# Altium footprint library lib_protel_HC_BOINA.PCBLIB: 726 footprints (part 7 of 46)
Each footprint in its own frame and in the unit in brackets; x right, y up, seen from the top. Pads: shape width x height; smd on the part's side, far side on the other; paste and mask are expansions set on the pad; w line width, h text height; cw(c..) or ccw(c..) is an arc to the next point about the centre after c.
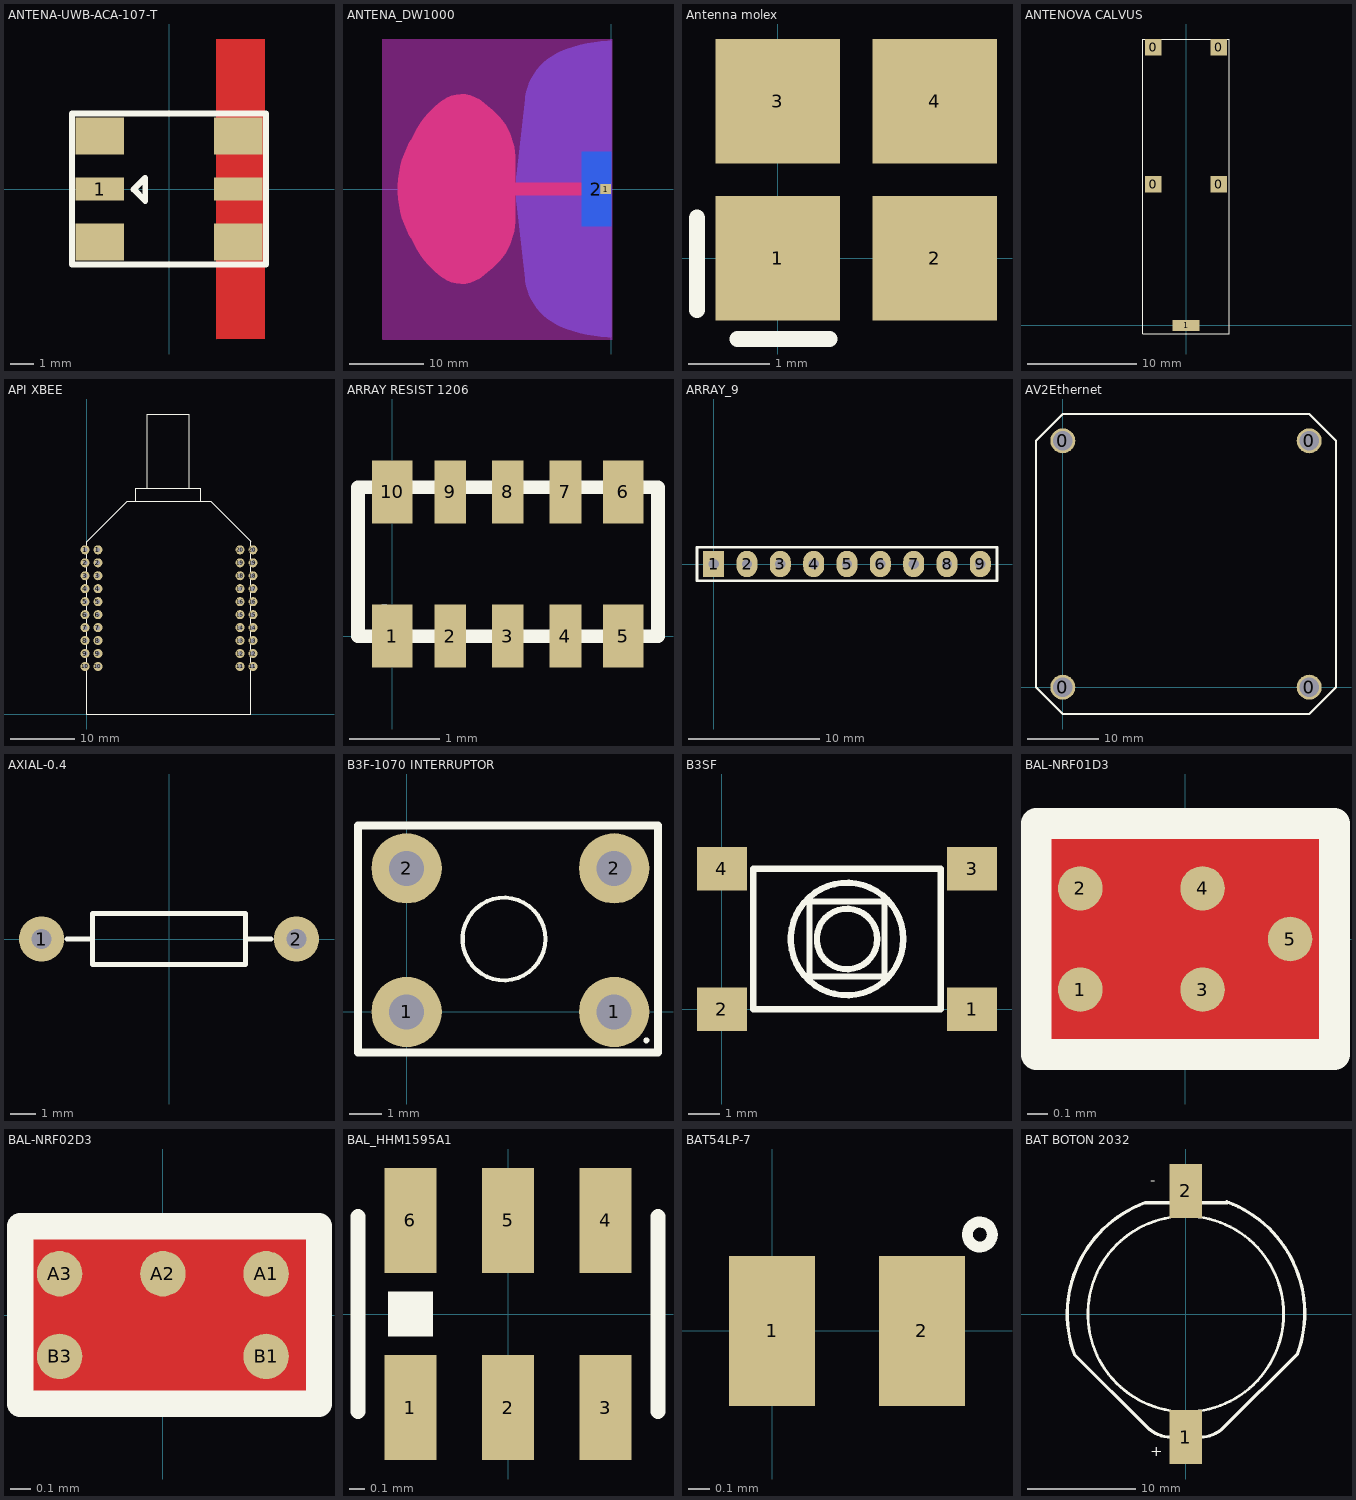
[diagram p6: the footprints below, top view; thin cyan lines are the x and y axes]

## ANTENA-UWB-ACA-107-T [mm] "Antena UWB ACA-107-T Abracom"
height 1.2
pads (6):
  rect 2.1x1 smd: 1(-3,0) ""(3,0)
  rect 2.1x1.6 smd: ""(-3,-2.3) ""(-3,2.3) ""(3,-2.3) ""(3,2.3)
Top Layer:
  region: 2.051,6.499 4.146,6.499 4.147,6.499 4.147,-6.499 2.049,-6.499
Top Overlay:
  lines w0.254: -4.2,-3.275 -4.2,3.275 4.2,3.275 4.2,-3.275 -4.2,-3.275 ; -1.531,-0.017 -1.031,-0.517 -1.031,0.483 -1.531,-0.017
3D body: height 1.2, standoff 0, extent -4,-3 4,3

## ANTENA_DW1000 [mm]
pads (2):
  rect 1.4x1.4 smd: 1(-0.77,0)
  rect 4x10 smd far side: 2(-2.005,0)
Top Layer:
  region: -26.165,-8.217 -26.166,-8.217 -27.034,-6.665 -27.034,-6.664 -27.252,-6.287 -27.638,-5.504 -27.972,-4.698 -28.253,-3.871 -28.479,-3.028 -28.649,-2.172 -28.763,-1.307 -28.82,-0.436 -28.82,0 -28.82,0.436 -28.763,1.307 -28.649,2.172 -28.479,3.028 -28.253,3.871 -27.972,4.698 -27.638,5.504 -27.252,6.287 -27.034,6.664 -27.034,6.665 -26.166,8.217 -26.165,8.217 -26.001,8.516 -25.636,9.091 -25.236,9.642 -24.801,10.167 -24.333,10.663 -23.836,11.128 -23.309,11.561 -22.757,11.96 -22.468,12.141 -22.19,12.315 -21.589,12.573 -20.956,12.737 -20.305,12.802 -19.652,12.768 -19.011,12.635 -18.398,12.406 -17.828,12.086 -17.57,11.885 -16.311,10.897 -16.31,10.895 -16.052,10.694 -15.567,10.252 -15.117,9.775 -14.705,9.266 -14.332,8.727 -14.001,8.161 -13.714,7.572 -13.472,6.963 -13.277,6.338 -13.129,5.699 -13.03,5.051 -12.981,4.398 -12.981,4.07 -12.981,0.82 -12.976,0.815 -0.005,0.815 -0.005,-0.815 -12.976,-0.815 -12.981,-0.82 -12.981,-4.07 -12.981,-4.398 -13.03,-5.051 -13.129,-5.699 -13.277,-6.338 -13.472,-6.963 -13.714,-7.572 -14.001,-8.161 -14.332,-8.727 -14.705,-9.266 -15.117,-9.775 -15.567,-10.252 -16.052,-10.694 -16.31,-10.895 -16.311,-10.897 -17.57,-11.885 -17.828,-12.086 -18.398,-12.406 -19.011,-12.635 -19.652,-12.768 -20.305,-12.802 -20.956,-12.737 -21.589,-12.573 -22.19,-12.315 -22.468,-12.141 -22.757,-11.96 -23.309,-11.561 -23.836,-11.128 -24.333,-10.663 -24.801,-10.167 -25.236,-9.642 -25.636,-9.091 -26.001,-8.516
Bottom Layer:
  region: -12.771,-1.998 -12.795,-1.749 -12.832,-1.25 -12.856,-0.75 -12.868,-0.25 -12.868,0 -12.868,0.25 -12.856,0.75 -12.832,1.25 -12.795,1.749 -12.771,1.998 -11.618,12.147 -11.584,12.477 -11.46,13.128 -11.281,13.766 -11.049,14.387 -10.764,14.985 -10.43,15.557 -10.048,16.099 -9.621,16.606 -9.153,17.075 -8.646,17.502 -8.105,17.885 -7.533,18.22 -7.234,18.363 -6.812,18.564 -5.947,18.919 -5.064,19.225 -4.165,19.482 -3.253,19.689 -2.331,19.844 -1.401,19.948 -0.468,20 0,20 0,-20 -0.468,-20 -1.401,-19.948 -2.331,-19.844 -3.253,-19.689 -4.165,-19.482 -5.064,-19.225 -5.947,-18.919 -6.812,-18.564 -7.234,-18.363 -7.533,-18.22 -8.105,-17.885 -8.646,-17.502 -9.153,-17.075 -9.621,-16.606 -10.048,-16.099 -10.43,-15.557 -10.764,-14.985 -11.049,-14.387 -11.281,-13.766 -11.46,-13.128 -11.584,-12.477 -11.618,-12.147
Keep-Out Layer:
  region: -30.88,-20.25 -30.88,20.25 0.12,20.25 0.12,-20.25
  lines w0.01: 0.12,-20.25 -30.88,-20.25 -30.88,20.25 0.12,20.25

## Antenna molex [mm] "0479480001"
pads (4):
  rect 1.54x1.54 smd: 1(0,0) 2(1.94,0) 3(0,1.94) 4(1.94,1.94)
Top Overlay:
  lines w0.2: -1,-0.64 -1,0.5 ; -0.5,-1 0.64,-1

## ANTENOVA CALVUS [mm] "ANTENA GPRS ANTENOVA CALVUS"
height 3.2
pads (5):
  rect 1.5x1.5 smd: 0(-3,12.95) 0(-3,25.51) 0(3,12.95) 0(3,25.51)
  rect 2.5x1 smd: 1(0,0)
Top Overlay:
  lines w0.08: -3.96,-0.75 3.96,-0.75 3.96,26.25 -3.96,26.25 -3.96,-0.75

## API XBEE [mm] "MODULO ZIGBEE DIGI"
height 3
pads (40):
  round 1.4 hole 0.7: 1(-0.27,25.419) 1(1.73,25.419) 2(-0.27,23.413) 2(1.73,23.413) 3(-0.27,21.406) 3(1.73,21.406) 4(-0.27,19.4) 4(1.73,19.4) 5(-0.27,17.393) 5(1.73,17.393) 6(-0.27,15.386) 6(1.73,15.386) 7(-0.27,13.38) 7(1.73,13.38) 8(-0.27,11.373) 8(1.73,11.373) 9(-0.27,9.367) 9(1.73,9.367) 10(-0.27,7.36) 10(1.73,7.36) 11(23.73,7.36) 11(25.73,7.36) 12(23.73,9.367) 12(25.73,9.367) 13(23.73,11.373) 13(25.73,11.373) 14(23.73,13.38) 14(25.73,13.38) 15(23.73,15.386) 15(25.73,15.386) 16(23.73,17.393) 16(25.73,17.393) 17(23.73,19.4) 17(25.73,19.4) 18(23.73,21.406) 18(25.73,21.406) 19(23.73,23.413) 19(25.73,23.413) 20(23.73,25.419) 20(25.73,25.419)
Top Overlay:
  lines w0.152: 0,26.5 0,0 25.4,0 25.4,26.5 ; 0,26.51 0,26.64 6.3,32.94 7.97,32.94 ; 7.95,32.94 17.45,32.94 ; 9.33,34.95 9.33,46.45 15.83,46.45 15.83,34.95 ; 17.41,32.94 19.21,32.94 25.4,26.75 25.4,26.49 ; 7.62,32.94 17.62,32.94 17.62,34.94 7.63,34.94 7.62,34.95 7.62,32.94

## ARRAY RESIST 1206 [mm]
height 0.6
pads (10):
  rect 0.45x0.7 smd: 1(0,0) 5(2.56,0) 6(2.56,1.6) 10(0,1.6)
  rect 0.35x0.7 smd: 2(0.64,0) 3(1.28,0) 4(1.92,0) 7(1.92,1.6) 8(1.28,1.6) 9(0.64,1.6)
Top Overlay:
  circle w0.127: c-0.09,0.26 r0.028
  lines w0.15: -0.381,0 2.946,0 2.946,1.651 -0.381,1.651 -0.381,0

## ARRAY_9 [mm] "array resistencias 9 pines"
pads (9):
  rect 1.6x2 hole 0.8: 1(0,0)
  oval 1.6x2 hole 0.8: 2(2.54,0) 3(5.08,0) 4(7.62,0) 5(10.16,0) 6(12.7,0) 7(15.24,0) 8(17.78,0) 9(20.32,0)
Top Overlay:
  lines w0.2: -1.27,-1.27 -1.27,1.27 21.59,1.27 21.59,-1.27 -1.27,-1.27

## AV2Ethernet [mm]
height 8
pads (4):
  round 3.5 hole 2.7: 0(0,0) 0(0,34.5) 0(34.5,0) 0(34.5,34.5)
Top Overlay:
  lines w0.3: -3.75,0 0,-3.75 34.5,-3.75 38.25,0 38.25,34.5 34.5,38.25 0,38.25 -3.75,34.5 -3.75,0

## AXIAL-0.4 [mm] "resistencia normal"
pads (2):
  round 1.8 hole 0.8: 1(-5.08,0) 2(5.08,0)
Top Overlay:
  lines w0.2: -4.064,0 -3.048,0 ; 3.048,0 4.064,0 ; -3.048,-1.016 -3.048,1.016 3.048,1.016 3.048,-1.016 -3.048,-1.016

## B3F-1070 INTERRUPTOR [mm] "INTERRUPTOR BOTÓN VERTICAL"
height 9.5
pads (4):
  round 2.2 hole 1.1: 1(0,0) 1(6.5,0) 2(0,4.5) 2(6.5,4.5)
Top Overlay:
  circle w0.127: c7.51,-0.89 r0.028
  circle w0.127: c3.048,2.286 r1.295
  lines w0.254: -1.524,-1.27 -1.524,5.842 7.874,5.842 7.874,-1.27 -1.524,-1.27

## B3SF [mm] "Tactile Switch SMD B3SF-XXXX de OMRON"
height 3.1
pads (4):
  rect 1.6x1.4 smd: 1(8,0) 2(0,0) 3(8,4.5) 4(0,4.5)
Top Overlay:
  circle w0.2: c4,2.25 r1.8
  circle w0.2: c4,2.25 r0.967
  lines w0.2: 1,0 7,0 7,4.5 1,4.5 1,0 ; 2.8,1.05 5.2,1.05 5.2,3.45 2.8,3.45 2.8,1.05

## BAL-NRF01D3 [mm] "Balun STMicroelectronics"
pads (5):
  round 0.22 smd mask+0.05: 1(-0.519,-0.25) 2(-0.519,0.25) 3(0.085,-0.25) 4(0.085,0.25) 5(0.518,0)
Top Layer:
  pour cut-out: -0.725,-0.57 0.745,-0.57 0.745,0.57 -0.725,0.57
Top Overlay:
  lines w0.152: -0.737,-0.57 0.737,-0.57 0.737,0.57 -0.737,0.57 -0.737,-0.57
3D body: height 0.17, standoff -0.05, extent -0.627,-0.359 -0.408,-0.14
3D body: height 0.17, standoff -0.05, extent -0.627,0.141 -0.408,0.36
3D body: height 0.17, standoff -0.05, extent -0.023,0.141 0.196,0.36
3D body: height 0.17, standoff -0.05, extent -0.023,-0.359 0.196,-0.14
3D body: height 0.17, standoff -0.05, extent 0.41,-0.109 0.629,0.11
3D body: height 0.63, standoff 0.51, extent -0.74,-0.55 0.74,0.55
3D body: height 0.51, standoff 0.11, extent -0.74,-0.55 0.74,0.55

## BAL-NRF02D3 [mm] "Balun for Nordic nRF51822 SoC"
pads (5):
  round 0.22 smd mask+0.035: A1(0.5,0.2) A2(0,0.2) A3(-0.5,0.2) B1(0.5,-0.2) B3(-0.5,-0.2)
Top Layer:
  pour cut-out: -0.697,-0.43 0.756,-0.43 0.756,0.44 -0.697,0.44
Top Overlay:
  lines w0.127: -0.69,-0.43 0.756,-0.43 0.756,0.43 -0.69,0.43 -0.69,-0.43
3D body: height 0.17, standoff -0.05, extent 0.391,-0.309 0.61,-0.09
3D body: height 0.17, standoff -0.05, extent 0.391,0.091 0.61,0.31
3D body: height 0.17, standoff -0.05, extent -0.109,0.091 0.11,0.31
3D body: height 0.17, standoff -0.05, extent -0.609,-0.309 -0.39,-0.09
3D body: height 0.17, standoff -0.05, extent -0.609,0.091 -0.39,0.31
3D body: height 0.51, standoff 0.11, extent -0.69,-0.43 0.759,0.43
3D body: height 0.63, standoff 0.51, extent -0.703,-0.43 0.76,0.43

## BAL_HHM1595A1 [mm] "Balun 3.0 - 8.0 GHz UWB"
height 1
pads (6):
  rect 0.35x0.7 smd: 1(-0.65,-0.625) 2(0,-0.625) 3(0.65,-0.625) 4(0.65,0.625) 5(0,0.625) 6(-0.65,0.625)
Top Overlay:
  rectangle: -0.8,-0.15 -0.5,0.15
  lines w0.1: -1,-0.65 -1,0.65 ; 1,-0.65 1,0.65
3D body: height 1, standoff 0, extent -1,-0.625 1,0.625

## BAT54LP-7 [mm] "DIODO SCHOTTKY"
height 0.5
pads (2):
  rect 0.4x0.7 smd: 1(0,0) 2(0.7,0)
Top Overlay:
  circle w0.051: c0.97,0.45 r0.058

## BAT BOTON 2032 [mm]
pads (2):
  rect 3x5 smd: 1(0,-11.43) 2(0,11.43)
Top Overlay:
  circle w0.254: c0,0 r9.087
  lines w0.2: 3.877,10.337 ccw(c3.877,10.601) 4.064,10.414
  lines w0.305: 3.81,10.414 cw(c0.048,0.077) 10.384,-3.685 3.537,-10.532 cw(c1.369,-8.364) 1.369,-11.43 0,-11.43 -1.399,-11.43 cw(c-1.399,-8.364) -3.567,-10.532 -10.337,-3.762 cw(c0,0) -3.762,10.337 3.877,10.337
  text "+" at -3.302,-13.208 h1.02
  text "-" at -3.302,11.938 h1.02